# Altium footprint library klp.PcbLib: 436 footprints (part 27 of 28)
Each footprint in its own frame and in the unit in brackets; x right, y up, seen from the top. Pads: shape width x height; smd on the part's side, far side on the other; paste and mask are expansions set on the pad; w line width, h text height; cw(c..) or ccw(c..) is an arc to the next point about the centre after c.
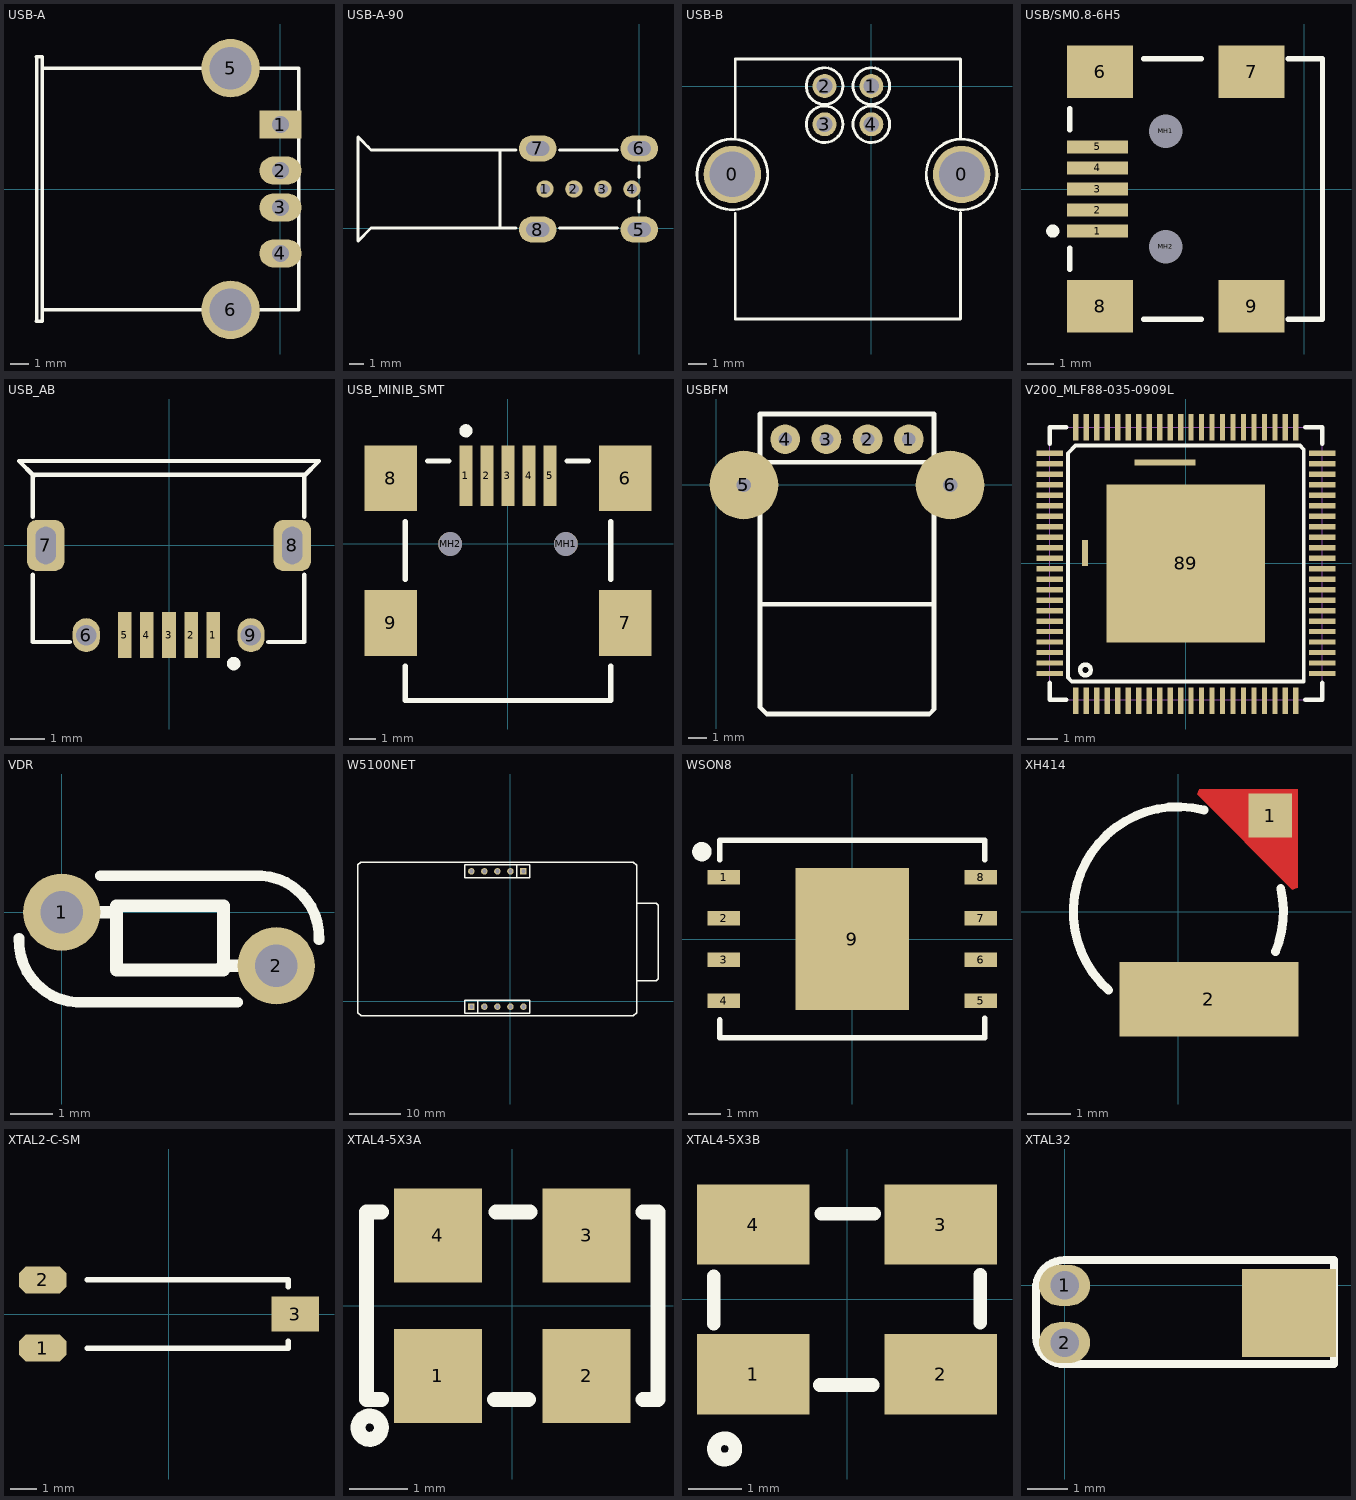
[diagram p26: the footprints below, top view; thin cyan lines are the x and y axes]

## USB-A [mil]
pads (6):
  rect 90x60 hole 36: 1(0,137.8)
  oval 90x60 hole 36: 2(0,39.37) 3(0,-39.37) 4(0,-137.8)
  round 125 hole 90.55: 5(-106.69,258.66) 6(-106.69,-258.66)
Top Overlay:
  lines w7.87: -522,-283 -522,283
  lines w8: -522,-283 -510,-283 -510,283 -522,283 ; -510,-258.66 39.37,-258.66 39.37,258.66 -510,258.66
3D body "Samtec-USBR-A-S-S-O-TH.STEP": height 297.24, standoff -129.92, extent -514.17,-310.83 43.31,311.21

## USB-A-90 [mm]
pads (8):
  round 1.2 hole 0.7: 1(-6.5,2.7) 2(-4.5,2.7) 3(-2.5,2.7) 4(-0.5,2.7)
  oval 2.6x1.8 hole 1 slot 1.6 at 0 deg: 5(0,-0.1) 6(0,5.5) 7(-7,5.5) 8(-7,-0.1)
Top Overlay:
  lines w0.203: -18.75,5.65 -18.5,5.4 ; -17.2,0 -8.5,0 ; -16.8,0 -18.5,0 -19.4,-0.9 -19.4,6.3 -18.5,5.4 ; -15.6,5.4 -18.5,5.4 ; -9.6,0 -9.6,5.4 ; -8.5,5.4 -18.5,5.4 ; -5.5,0 -1.5,0 ; -5.5,5.4 -1.5,5.4 ; 0,1.1 0,1.9 ; 0,3.5 0,4.3

## USB-B [mil]
pads (6):
  round 120 hole 95: 0(-291,-185) 0(189,-185)
  round 50 hole 33: 1(0,0) 2(-98,0) 3(-98,-80) 4(0,-80)
Top Overlay:
  circle w6: c-98,0 r38.3
  circle w6: c-98,-80 r38.3
  circle w6: c0,0 r38.3
  circle w6: c0,-80 r38.3
  lines w6: -365.04,-185 ccw(c-291,-185) -365,-182.5 ; -285,-266.5 -285,-488 187,-488 187,-264.5 ; -285,-108.5 -285,57 187,57 187,-110.5 ; 114.96,-185 ccw(c189,-185) 115,-182.5

## USB/SM0.8-6H5 [mm]
height 1
pads (11):
  rect 2.3x0.5 smd: 1(-7.85,-1.6) 2(-7.85,-0.8) 3(-7.85,0) 4(-7.85,0.8) 5(-7.85,1.6)
  rect 2.5x2 smd: 6(-7.75,4.45) 7(-1.996,4.45) 8(-7.75,-4.45) 9(-1.996,-4.45)
  round 0.6 hole 1.27 unplated: MH1(-5.25,2.2) MH2(-5.25,-2.2)
Top Overlay:
  circle w0.25: c-9.55,-1.6 r0.125
  lines w0.2: -8.9,-3.05 -8.9,-2.25 ; -8.9,2.25 -8.9,3.05 ; -6.1,-4.95 -3.9,-4.95 ; -6.1,4.95 -3.9,4.95 ; -0.6,-4.95 0.7,-4.95 0.7,4.95 -0.6,4.95

## USB_AB [mm]
pads (9):
  rect 0.4x1.35 smd: 1(1.3,-2.642) 2(0.65,-2.642) 3(0,-2.642) 4(-0.65,-2.642) 5(-1.3,-2.642)
  oval 0.8x1 hole 0.6: 6(-2.438,-2.642) 9(2.413,-2.642)
  rrect50% 1.1x1.5 hole 0.6 slot 1.1 at 90 deg: 7(-3.632,0) 8(3.632,0)
Top Overlay:
  circle w0.2: c1.907,-3.48 r0.1
  lines w0.127: -4.013,-0.864 -4.013,-2.845 -2.921,-2.845 ; -4.013,0.851 -4.013,2.083 -2.438,2.083 ; -3.988,2.057 -4.42,2.489 4.42,2.489 3.988,2.057 ; -3.988,2.083 3.988,2.083 3.988,0.851 ; 2.921,-2.845 3.988,-2.845 3.988,-0.864

## USB_MINIB_SMT [mm]
pads (11):
  rect 0.5x2.3 smd: 1(-1.6,2.6) 2(-0.8,2.6) 3(0,2.6) 4(0.8,2.6) 5(1.6,2.6)
  rect 2x2.5 smd: 6(4.45,2.5) 7(4.45,-3) 8(-4.45,2.5) 9(-4.45,-3)
  round 0.9 hole 0.9 unplated: MH1(2.2,0) MH2(-2.2,0)
Top Overlay:
  circle w0.25: c-1.6,4.3 r0.125
  lines w0.2: -3.9,-4.65 -3.9,-5.95 3.9,-5.95 3.9,-4.65 ; -3.9,-1.35 -3.9,0.85 ; -3.05,3.15 -2.25,3.15 ; 2.25,3.15 3.05,3.15 ; 3.9,-1.35 3.9,0.85
3D body "User Library-USB_mini_B.STEP": height 3.95, standoff -1, extent -5.35,-5.9 5.35,3.3

## USBFM [mil] "USBFM"
height 196.85
pads (6):
  round 65 hole 30: 1(420,100) 2(330,100) 3(240,100) 4(150,100)
  round 150 hole 31.5: 5(60,0) 6(510,0)
Top Overlay:
  lines w10: 95,-260 475,-260 ; 95,50 475,50 ; 95,-485 95,-195 95,155 475,155 475,-195 475,-490 465,-500 110,-500 95,-485

## V200_MLF88-035-0909L [mil]
pads (91):
  rect 7x35 smd: 1(-144.69,-180.42) 2(-130.91,-180.42) 3(-117.13,-180.42) 4(-103.35,-180.42) 5(-89.57,-180.42) 6(-75.79,-180.42) 7(-62.01,-180.42) 8(-48.23,-180.42) 9(-34.45,-180.42) 10(-20.67,-180.42) 11(-6.89,-180.42) 12(6.89,-180.42) 13(20.67,-180.42) 14(34.45,-180.42) 15(48.23,-180.42) 16(62.01,-180.42) 17(75.79,-180.42) 18(89.57,-180.42) 19(103.35,-180.42) 20(117.13,-180.42) 21(130.91,-180.42) 22(144.69,-180.42) 45(144.69,179) 46(130.91,179) 47(117.13,179) 48(103.35,179) 49(89.57,179) 50(75.79,179) 51(62.01,179) 52(48.23,179) 53(34.45,179) 54(20.67,179) 55(6.89,179) 56(-6.89,179) 57(-20.67,179) 58(-34.45,179) 59(-48.23,179) 60(-62.01,179) 61(-75.79,179) 62(-89.57,179) 63(-103.35,179) 64(-117.13,179) 65(-130.91,179) 66(-144.69,179)
  rect 35x7 smd: 23(179.42,-144.69) 24(179.42,-130.91) 25(179.42,-117.13) 26(179.42,-103.35) 27(179.42,-89.57) 28(179.42,-75.79) 29(179.42,-62.01) 30(179.42,-48.23) 31(179.42,-34.45) 32(179.42,-20.67) 33(179.42,-6.89) 34(179.42,6.89) 35(179.42,20.67) 36(179.42,34.45) 37(179.42,48.23) 38(179.42,62.01) 39(179.42,75.79) 40(179.42,89.57) 41(179.42,103.35) 42(179.42,117.13) 43(179.42,130.91) 44(179.42,144.69) 67(-179,144.69) 68(-179,130.91) 69(-179,117.13) 70(-179,103.35) 71(-179,89.57) 72(-179,75.79) 73(-179,62.01) 74(-179,48.23) 75(-179,34.45) 76(-179,20.67) 77(-179,6.89) 78(-179,-6.89) 79(-179,-20.67) 80(-179,-34.45) 81(-179,-48.23) 82(-179,-62.01) 83(-179,-75.79) 84(-179,-89.57) 85(-179,-103.35) 86(-179,-117.13) 87(-179,-130.91) 88(-179,-144.69)
  rect 208x208 smd: 89(0,0)
  rect 80x8 smd: 90(-27.56,132.48)
  rect 8x34 smd: 91(-132.48,13.78)
Top Overlay:
  circle w6: c-132,-140 r7
  lines w5: -155,-150 -155,145 -145,155 150,155 155,150 155,-155 -150,-155 -155,-150
  lines w6: -179.13,-157.19 -179.13,-179.13 -157.19,-179.13 ; -179.13,157.19 -179.13,179.13 -157.19,179.13 ; 157.19,-179.13 179.13,-179.13 179.13,-157.19 ; 157.19,179.13 179.13,179.13 179.13,157.19
Mechanical 16:
  lines w1: -179.13,-179.13 -179.13,179.13 179.13,179.13 179.13,-179.13 -179.13,-179.13

## VDR [mil] "PIN:5.08;SIZE:7*3;"
height 118.11
pads (2):
  round 72 hole 40: 1(0,0) 2(200,-50)
Top Overlay:
  lines w10: -39.86,-24.34 ccw(c17.09,-27.07) 14,-84 164,-84 ; 36,34 186,34 cw(c182.91,-22.93) 239.86,-25.66
  lines w12: 0,0 50,0 ; 150,-50 200,-50 ; 51,-54 51,6 151,6 151,-24 151,-54 51,-54

## W5100NET [mil] "NET_FOOT"
pads (10):
  rect 50x50 hole 32: 1(101,1000) 6(-299,-40)
  round 50 hole 32: 2(1,1000) 3(-99,1000) 4(-199,1000) 5(-299,1000) 7(-199,-40) 8(-99,-40) 9(1,-40) 10(101,-40)
Top Overlay:
  lines w10: -1020,1070 945,1070 970,1045 970,-85 945,-110 -1145,-110 -1170,-85 -1170,1050 -1150,1070 -530,1070 ; -249,-90 -249,10 ; 51,950 51,1050 ; 970,160 1120,160 1135,175 1135,740 1120,755 975,755 970,750 ; -349,-90 -349,10 151,10 151,-90 -349,-90 ; -349,950 151,950 151,1050 -349,1050 -349,950

## WSON8 [mm]
pads (9):
  rect 1x0.45 smd: 1(-3.975,1.905) 2(-3.975,0.635) 3(-3.975,-0.635) 4(-3.975,-1.905) 5(3.975,-1.905) 6(3.975,-0.635) 7(3.975,0.635) 8(3.975,1.905)
  rect 3.5x4.4 smd: 9(0,0)
Top Overlay:
  circle w0.3: c-4.65,2.7 r0.15
  lines w0.178: -4.1,-2.504 -4.1,-3.05 4.1,-3.05 4.1,-2.449 ; -4.1,2.449 -4.1,3.05 4.1,3.05 ; 4.1,2.449 4.1,3.048
Mechanical 15:
  lines w0.1: -0.5,0 0.5,0 ; 0,-0.5 0,0.5
3D body "User Library-WSON-8_6x8mm.STEP": height 0.81, standoff -0.07, extent -4.075,-2.995 3.925,3.005

## XH414 [mm]
pads (2):
  rect 1x1 smd: 1(2.1,2.2)
  rect 4.1x1.7 smd: 2(0.7,-2)
Top Layer:
  region: 2.724,0.553 2.606,0.504 0.428,2.683 0.476,2.8 2.724,2.8
Top Overlay:
  lines w0.203: -1.594,-1.794 cw(c0,0) 0.582,2.328 ; 2.221,-0.909 ccw(c0,0) 2.34,0.532
Top Solder:
  region: 2.706,0.559 2.589,0.511 0.411,2.689 0.459,2.806 2.706,2.806

## XTAL2-C-SM [mil]
pads (3):
  oct 70x40 smd: 1(-185,-50) 2(-185,50)
  rect 70x52 smd: 3(185,0)
Top Overlay:
  lines w8: -120,-50 175,-50 175,-40 ; -120,50 175,50 175,40

## XTAL4-5X3A [mm]
pads (4):
  rect 1.5x1.6 smd: 1(-1.27,-1.2) 2(1.27,-1.2) 3(1.27,1.2) 4(-1.27,1.2)
Top Overlay:
  circle w0.254: c-2.435,-2.083 r0.2
  lines w0.254: -2.235,-1.6 -2.489,-1.6 -2.489,1.6 -2.235,1.6 ; -0.305,-1.6 0.279,-1.6 ; -0.279,1.6 0.305,1.6 ; 2.235,-1.6 2.489,-1.6 2.489,1.6 2.235,1.6
3D body: height 1, standoff 0, extent -2.489,-1.6 2.489,1.6

## XTAL4-5X3B [mm]
pads (4):
  rect 2.1x1.5 smd: 1(-1.753,-1.397) 2(1.753,-1.397) 3(1.753,1.397) 4(-1.753,1.397)
Top Overlay:
  circle w0.254: c-2.286,-2.794 r0.2
  lines w0.254: -2.489,-0.457 -2.489,0.432 ; -0.508,-1.6 0.483,-1.6 ; -0.483,1.6 0.508,1.6 ; 2.489,-0.432 2.489,0.457

## XTAL32 [mil]
pads (3):
  oval 50x40 hole 28: 1(0,0) 2(0,-56)
  rect 92.13x86 smd: ""(220,-27)
Top Overlay:
  lines w8: -28,-50 ccw(c-0.5,-49.5) 0,-77 264,-77 264,25 0,25 ccw(c0.5,-3.5) -28,-4 -28,-50